# Altium footprint library LukaLIBRARY.PcbLib: 772 footprints (part 15 of 49)
Each footprint in its own frame and in the unit in brackets; x right, y up, seen from the top. Pads: shape width x height; smd on the part's side, far side on the other; paste and mask are expansions set on the pad; w line width, h text height; cw(c..) or ccw(c..) is an arc to the next point about the centre after c.
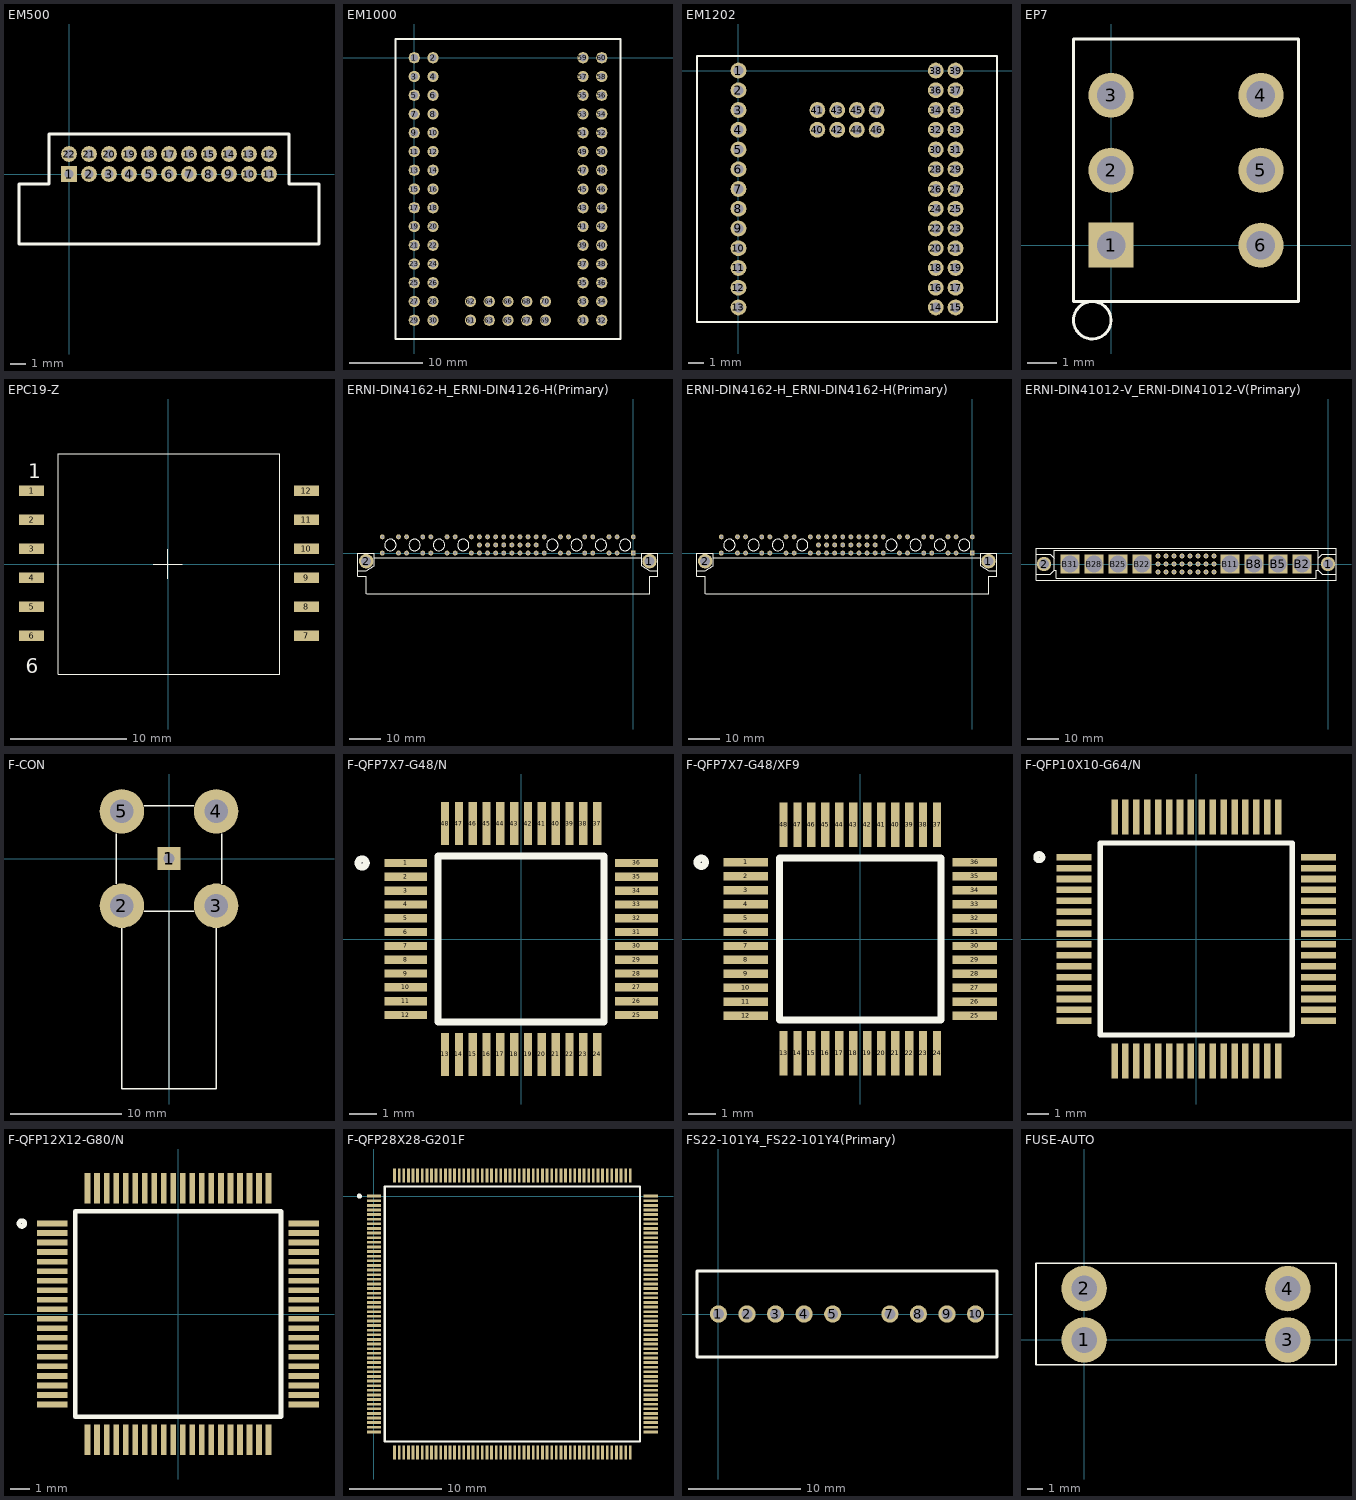
[diagram p14: the footprints below, top view; thin cyan lines are the x and y axes]

## EM500 [mm]
pads (22):
  rect 1x1 hole 0.6 mask-25.4: 1(0,0)
  round 1 hole 0.6 mask-25.4: 2(1.27,0) 3(2.54,0) 4(3.81,0) 5(5.08,0) 6(6.35,0) 7(7.62,0) 8(8.89,0) 9(10.16,0) 10(11.43,0) 11(12.7,0) 12(12.7,1.27) 13(11.43,1.27) 14(10.16,1.27) 15(8.89,1.27) 16(7.62,1.27) 17(6.35,1.27) 18(5.08,1.27) 19(3.81,1.27) 20(2.54,1.27) 21(1.27,1.27) 22(0,1.27)
Top Overlay:
  lines w0.2: -3.175,-4.445 -3.175,-0.635 -1.27,-0.635 -1.27,2.54 13.97,2.54 13.97,-0.635 15.875,-0.635 15.875,-4.445 -3.175,-4.445
Top Solder:
  drawing of 22 lines, arcs and shapes, not listed
Bottom Solder:
  drawing of 22 lines, arcs and shapes, not listed

## EM1000 [mil]
pads (70):
  round 60 hole 38: 1(0,0) 2(100,0) 3(0,-100) 4(100,-100) 5(0,-200) 6(100,-200) 7(0,-300) 8(100,-300) 9(0,-400) 10(100,-400) 11(0,-500) 12(100,-500) 13(0,-600) 14(100,-600) 15(0,-700) 16(100,-700) 17(0,-800) 18(100,-800) 19(0,-900) 20(100,-900) 21(0,-1000) 22(100,-1000) 23(0,-1100) 24(100,-1100) 25(0,-1200) 26(100,-1200) 27(0,-1300) 28(100,-1300) 29(0,-1400) 30(100,-1400) 31(900,-1400) 32(1000,-1400) 33(900,-1300) 34(1000,-1300) 35(900,-1200) 36(1000,-1200) 37(900,-1100) 38(1000,-1100) 39(900,-1000) 40(1000,-1000) 41(900,-900) 42(1000,-900) 43(900,-800) 44(1000,-800) 45(900,-700) 46(1000,-700) 47(900,-600) 48(1000,-600) 49(900,-500) 50(1000,-500) 51(900,-400) 52(1000,-400) 53(900,-300) 54(1000,-300) 55(900,-200) 56(1000,-200) 57(900,-100) 58(1000,-100) 59(900,0) 60(1000,0) 61(300,-1400) 62(300,-1300) 63(400,-1400) 64(400,-1300) 65(500,-1400) 66(500,-1300) 67(600,-1400) 68(600,-1300) 69(700,-1400) 70(700,-1300)
Top Overlay:
  lines w10: -100,-1500 1100,-1500 1100,100 -100,100 -100,-1500

## EM1202 [mil]
pads (47):
  round 40 hole 25: 1(0,0) 2(0,-50) 3(0,-100) 4(0,-150) 5(0,-200) 6(0,-250) 7(0,-300) 8(0,-350) 9(0,-400) 10(0,-450) 11(0,-500) 12(0,-550) 13(0,-600) 14(500,-600) 15(550,-600) 16(500,-550) 17(550,-550) 18(500,-500) 19(550,-500) 20(500,-450) 21(550,-450) 22(500,-400) 23(550,-400) 24(500,-350) 25(550,-350) 26(500,-300) 27(550,-300) 28(500,-250) 29(550,-250) 30(500,-200) 31(550,-200) 32(500,-150) 33(550,-150) 34(500,-100) 35(550,-100) 36(500,-50) 37(550,-50) 38(500,0) 39(550,0) 40(200,-150) 41(200,-100) 42(250,-150) 43(250,-100) 44(300,-150) 45(300,-100) 46(350,-150) 47(350,-100)
Top Overlay:
  lines w5: -105,-637 -105,37 655,37 655,-637 -105,-637

## EP7 [mil]
pads (6):
  rect 60x60 hole 38 mask-1000: 1(0,0)
  round 60 hole 38 mask-1000: 2(0,100) 3(0,200) 4(200,200) 5(200,100)
  round 60 hole 38: 6(200,0)
Top Overlay:
  circle w3.94: c-25,-100 r25
  lines w1: -50,-50 -50,50
  lines w3.94: -50,-75 -50,275 250,275 250,-75 -50,-75
Top Solder:
  region: 200,130.26 192.17,129.23 184.87,126.2 178.6,121.4 173.79,115.13 170.77,107.83 169.74,100 170.77,92.17 173.79,84.87 178.6,78.6 184.87,73.8 192.17,70.77 200,69.74 207.83,70.77 215.13,73.8 221.4,78.6 226.21,84.87 229.23,92.17 230.26,100 229.23,107.83 226.21,115.13 221.4,121.4 215.13,126.2 207.83,129.23
  region: 200,230.26 192.17,229.23 184.87,226.21 178.6,221.4 173.79,215.13 170.77,207.83 169.74,200 170.77,192.17 173.79,184.87 178.6,178.6 184.87,173.79 192.17,170.77 200,169.74 207.83,170.77 215.13,173.79 221.4,178.6 226.21,184.87 229.23,192.17 230.26,200 229.23,207.83 226.21,215.13 221.4,221.4 215.13,226.21 207.83,229.23
  region: 0,130.26 -7.83,129.23 -15.13,126.2 -21.4,121.4 -26.2,115.13 -29.23,107.83 -30.26,100 -29.23,92.17 -26.2,84.87 -21.4,78.6 -15.13,73.8 -7.83,70.77 0,69.74 7.83,70.77 15.13,73.8 21.4,78.6 26.2,84.87 29.23,92.17 30.26,100 29.23,107.83 26.2,115.13 21.4,121.4 15.13,126.2 7.83,129.23
  region: 0,230.26 -7.83,229.23 -15.13,226.21 -21.4,221.4 -26.2,215.13 -29.23,207.83 -30.26,200 -29.23,192.17 -26.2,184.87 -21.4,178.6 -15.13,173.79 -7.83,170.77 0,169.74 7.83,170.77 15.13,173.79 21.4,178.6 26.2,184.87 29.23,192.17 30.26,200 29.23,207.83 26.2,215.13 21.4,221.4 15.13,226.21 7.83,229.23
  region: -30,-30 30,-30 30,30 -30,30
Bottom Solder:
  region: 200,130.26 192.17,129.23 184.87,126.2 178.6,121.4 173.79,115.13 170.77,107.83 169.74,100 170.77,92.17 173.79,84.87 178.6,78.6 184.87,73.8 192.17,70.77 200,69.74 207.83,70.77 215.13,73.8 221.4,78.6 226.21,84.87 229.23,92.17 230.26,100 229.23,107.83 226.21,115.13 221.4,121.4 215.13,126.2 207.83,129.23
  region: 200,230.26 192.17,229.23 184.87,226.21 178.6,221.4 173.79,215.13 170.77,207.83 169.74,200 170.77,192.17 173.79,184.87 178.6,178.6 184.87,173.79 192.17,170.77 200,169.74 207.83,170.77 215.13,173.79 221.4,178.6 226.21,184.87 229.23,192.17 230.26,200 229.23,207.83 226.21,215.13 221.4,221.4 215.13,226.21 207.83,229.23
  region: 0,130.26 -7.83,129.23 -15.13,126.2 -21.4,121.4 -26.2,115.13 -29.23,107.83 -30.26,100 -29.23,92.17 -26.2,84.87 -21.4,78.6 -15.13,73.8 -7.83,70.77 0,69.74 7.83,70.77 15.13,73.8 21.4,78.6 26.2,84.87 29.23,92.17 30.26,100 29.23,107.83 26.2,115.13 21.4,121.4 15.13,126.2 7.83,129.23
  region: 0,230.26 -7.83,229.23 -15.13,226.21 -21.4,221.4 -26.2,215.13 -29.23,207.83 -30.26,200 -29.23,192.17 -26.2,184.87 -21.4,178.6 -15.13,173.79 -7.83,170.77 0,169.74 7.83,170.77 15.13,173.79 21.4,178.6 26.2,184.87 29.23,192.17 30.26,200 29.23,207.83 26.2,215.13 21.4,221.4 15.13,226.21 7.83,229.23
  region: -30,-30 30,-30 30,30 -30,30

## EPC19-Z [mm]
pads (12):
  rect 2.159x0.914 smd mask-25.4: 1(-11.8,6.3) 2(-11.8,3.8) 3(-11.8,1.3) 4(-11.8,-1.2) 5(-11.8,-3.7) 6(-11.8,-6.2) 7(11.9,-6.2) 8(11.9,-3.7) 9(11.9,-1.2) 10(11.9,1.3) 11(11.9,3.8) 12(11.9,6.3)
Top Overlay:
  lines w0.1: -1.32,0 1.21,0 ; -0.05,-1.26 -0.05,0 -0.05,1.27 ; -9.5,-9.5 -9.5,9.5 9.6,9.5 9.6,-9.5 -9.5,-9.5
  text "6" at -12.3,-9.4 h1.25
  text "1" at -12.1,7.4 h1.25
Top Solder:
  region: -10.72,-4.157 -10.72,-3.243 -12.879,-3.243 -12.879,-4.157
  region: -10.72,-6.657 -10.72,-5.743 -12.879,-5.743 -12.879,-6.657
  region: -10.72,3.343 -10.72,4.257 -12.879,4.257 -12.879,3.343
  region: -10.72,0.843 -10.72,1.757 -12.879,1.757 -12.879,0.843
  region: -10.72,-1.657 -10.72,-0.743 -12.879,-0.743 -12.879,-1.657
  region: -10.72,5.843 -10.72,6.757 -12.879,6.757 -12.879,5.843
  region: 12.979,-6.657 12.979,-5.743 10.82,-5.743 10.82,-6.657
  region: 12.979,-4.157 12.979,-3.243 10.82,-3.243 10.82,-4.157
  region: 12.979,-1.657 12.979,-0.743 10.82,-0.743 10.82,-1.657
  region: 12.979,0.843 12.979,1.757 10.82,1.757 10.82,0.843
  region: 12.979,3.343 12.979,4.257 10.82,4.257 10.82,3.343
  region: 12.979,5.843 12.979,6.757 10.82,6.757 10.82,5.843

## ERNI-DIN4162-H_ERNI-DIN4126-H(Primary) [mil]
pads (58):
  round 180 hole 120: 1(200,-100) 2(-3300,-100)
  rect 60x60 hole 38 mask-1000: A1(0,0)
  round 60 hole 38 mask-1000: A3(-200,0) A4(-300,0) A6(-500,0) A7(-600,0) A9(-800,0) A10(-900,0) A12(-1100,0) A13(-1200,0) A14(-1300,0) A15(-1400,0) A16(-1500,0) A17(-1600,0) A18(-1700,0) A19(-1800,0) A20(-1900,0) A21(-2000,0) A23(-2200,0) A24(-2300,0) A26(-2500,0) A27(-2600,0) A29(-2800,0) A30(-2900,0) A32(-3100,0) B13(-1200,100) B14(-1300,100) B15(-1400,100) B16(-1500,100) B17(-1600,100) B18(-1700,100) B19(-1800,100) B20(-1900,100) C1(0,200) C3(-200,200) C4(-300,200) C6(-500,200) C7(-600,200) C9(-800,200) C10(-900,200) C12(-1100,200) C13(-1200,200) C14(-1300,200) C15(-1400,200) C16(-1500,200) C17(-1600,200) C18(-1700,200) C19(-1800,200) C20(-1900,200) C21(-2000,200) C23(-2200,200) C24(-2300,200) C26(-2500,200) C27(-2600,200) C29(-2800,200) C30(-2900,200) C32(-3100,200)
Top Overlay:
  circle w3.94: c-1000,100 r70.71
  circle w3.94: c-700,100 r70.71
  circle w3.94: c-400,100 r70.71
  circle w3.94: c-100,100 r70.71
  circle w3.94: c-3000,100 r70.71
  circle w3.94: c-2700,100 r70.71
  circle w3.94: c-2400,100 r70.71
  circle w3.94: c-2100,100 r70.71
  lines w1: -3400,-220 -3300,-220 -3200,-155 -3200,-55 ; 105,-55 105,-155 205,-220 305,-220
  lines w10: -3300,-500 -3300,-285 -3400,-285 -3400,-5 -3200,-5 -3200,-55 105,-55 105,-5 305,-5 305,-285 205,-285 205,-500 -3295,-500
Top Solder:
  drawing of 56 lines, arcs and shapes, not listed
Bottom Solder:
  drawing of 56 lines, arcs and shapes, not listed

## ERNI-DIN4162-H_ERNI-DIN4162-H(Primary) [mil]
pads (58):
  round 180 hole 120: 1(200,-100) 2(-3300,-100)
  rect 60x60 hole 38 mask-1000: A1(0,0)
  round 60 hole 38 mask-1000: A3(-200,0) A4(-300,0) A6(-500,0) A7(-600,0) A9(-800,0) A10(-900,0) A12(-1100,0) A13(-1200,0) A14(-1300,0) A15(-1400,0) A16(-1500,0) A17(-1600,0) A18(-1700,0) A19(-1800,0) A20(-1900,0) A21(-2000,0) A23(-2200,0) A24(-2300,0) A26(-2500,0) A27(-2600,0) A29(-2800,0) A30(-2900,0) A32(-3100,0) B13(-1200,100) B14(-1300,100) B15(-1400,100) B16(-1500,100) B17(-1600,100) B18(-1700,100) B19(-1800,100) B20(-1900,100) C1(0,200) C3(-200,200) C4(-300,200) C6(-500,200) C7(-600,200) C9(-800,200) C10(-900,200) C12(-1100,200) C13(-1200,200) C14(-1300,200) C15(-1400,200) C16(-1500,200) C17(-1600,200) C18(-1700,200) C19(-1800,200) C20(-1900,200) C21(-2000,200) C23(-2200,200) C24(-2300,200) C26(-2500,200) C27(-2600,200) C29(-2800,200) C30(-2900,200) C32(-3100,200)
Top Overlay:
  circle w3.94: c-1000,100 r70.71
  circle w3.94: c-700,100 r70.71
  circle w3.94: c-400,100 r70.71
  circle w3.94: c-100,100 r70.71
  circle w3.94: c-3000,100 r70.71
  circle w3.94: c-2700,100 r70.71
  circle w3.94: c-2400,100 r70.71
  circle w3.94: c-2100,100 r70.71
  lines w1: -3400,-220 -3300,-220 -3200,-155 -3200,-55 ; 105,-55 105,-155 205,-220 305,-220
  lines w10: -3300,-500 -3300,-285 -3400,-285 -3400,-5 -3200,-5 -3200,-55 105,-55 105,-5 305,-5 305,-285 205,-285 205,-500 -3295,-500
Top Solder:
  drawing of 56 lines, arcs and shapes, not listed
Bottom Solder:
  drawing of 56 lines, arcs and shapes, not listed

## ERNI-DIN41012-V_ERNI-DIN41012-V(Primary) [mil]
pads (34):
  round 180 hole 120: 1(0,0) 2(-3550,0)
  round 60 hole 38 mask-1000: A13(-1425,100) A14(-1525,100) A15(-1625,100) A16(-1725,100) A17(-1825,100) A18(-1925,100) A19(-2025,100) A20(-2125,100) B13(-1425,0) B14(-1525,0) B15(-1625,0) B16(-1725,0) B17(-1825,0) B18(-1925,0) B19(-2025,0) B20(-2125,0) C13(-1425,-100) C14(-1525,-100) C15(-1625,-100) C16(-1725,-100) C17(-1825,-100) C18(-1925,-100) C19(-2025,-100) C20(-2125,-100)
  rect 236.22x236.22 hole 216.54 mask-1000: B2(-325,0) B5(-625,0) B8(-925,0) B11(-1225,0) B22(-2325,0) B25(-2625,0) B28(-2925,0) B31(-3225,0)
Top Overlay:
  lines w1: -3650,-125 -3475,-125 -3425,-75 ; -3650,125 -3475,125 -3425,75 ; 100,-125 -75,-125 -125,-75 ; 100,125 -75,125 -125,75 ; -3425,-75 -3400,-75 -3400,-175 -150,-175 -150,-75 -125,-75 ; -3425,-75 -3425,-25 -3425,75 ; -3425,75 -3425,175 -125,175 -125,75 ; -125,-75 -125,25 -125,75
  lines w10: -3650,-200 100,-200 100,200 -3650,200 -3650,-200
Top Solder:
  drawing of 32 lines, arcs and shapes, not listed
Bottom Solder:
  drawing of 32 lines, arcs and shapes, not listed

## F-CON [mm]
pads (5):
  rect 2.032x2.032 hole 1.016 mask-25.4: 1(0,0)
  round 4 hole 2.1 mask-25.4: 2(-4.25,-4.25) 3(4.25,-4.25) 4(4.25,4.25) 5(-4.25,4.25)
Top Overlay:
  lines w0.025: 0,-20.75 0,-4.75
  lines w0.125: -4.75,-2.25 -4.75,2.25 ; -4.25,-6.25 -4.25,-20.75 4.25,-20.75 4.25,-6.25 ; -2.25,-4.75 2.25,-4.75 ; -2.25,4.75 2.25,4.75 ; 4.75,-2.25 4.75,2.25
Top Solder:
  region: -4.25,6.26 -4.642,6.221 -5.019,6.107 -5.367,5.921 -5.671,5.671 -5.921,5.367 -6.107,5.019 -6.221,4.642 -6.26,4.25 -6.221,3.858 -6.107,3.481 -5.921,3.133 -5.671,2.829 -5.367,2.579 -5.019,2.393 -4.642,2.279 -4.25,2.24 -3.858,2.279 -3.481,2.393 -3.133,2.579 -2.829,2.829 -2.579,3.133 -2.393,3.481 -2.279,3.858 -2.24,4.25 -2.279,4.642 -2.393,5.019 -2.579,5.367 -2.829,5.671 -3.133,5.921 -3.481,6.107 -3.858,6.221
  region: 4.25,6.26 3.858,6.221 3.481,6.107 3.133,5.921 2.829,5.671 2.579,5.367 2.393,5.019 2.279,4.642 2.24,4.25 2.279,3.858 2.393,3.481 2.579,3.133 2.829,2.829 3.133,2.579 3.481,2.393 3.858,2.279 4.25,2.24 4.642,2.279 5.019,2.393 5.367,2.579 5.671,2.829 5.921,3.133 6.107,3.481 6.221,3.858 6.26,4.25 6.221,4.642 6.107,5.019 5.921,5.367 5.671,5.671 5.367,5.921 5.019,6.107 4.642,6.221
  region: -4.25,-2.24 -4.642,-2.279 -5.019,-2.393 -5.367,-2.579 -5.671,-2.829 -5.921,-3.133 -6.107,-3.481 -6.221,-3.858 -6.26,-4.25 -6.221,-4.642 -6.107,-5.019 -5.921,-5.367 -5.671,-5.671 -5.367,-5.921 -5.019,-6.107 -4.642,-6.221 -4.25,-6.26 -3.858,-6.221 -3.481,-6.107 -3.133,-5.921 -2.829,-5.671 -2.579,-5.367 -2.393,-5.019 -2.279,-4.642 -2.24,-4.25 -2.279,-3.858 -2.393,-3.481 -2.579,-3.133 -2.829,-2.829 -3.133,-2.579 -3.481,-2.393 -3.858,-2.279
  region: 4.25,-2.24 3.858,-2.279 3.481,-2.393 3.133,-2.579 2.829,-2.829 2.579,-3.133 2.393,-3.481 2.279,-3.858 2.24,-4.25 2.279,-4.642 2.393,-5.019 2.579,-5.367 2.829,-5.671 3.133,-5.921 3.481,-6.107 3.858,-6.221 4.25,-6.26 4.642,-6.221 5.019,-6.107 5.367,-5.921 5.671,-5.671 5.921,-5.367 6.107,-5.019 6.221,-4.642 6.26,-4.25 6.221,-3.858 6.107,-3.481 5.921,-3.133 5.671,-2.829 5.367,-2.579 5.019,-2.393 4.642,-2.279
  region: -1.016,-1.016 1.016,-1.016 1.016,1.016 -1.016,1.016
Bottom Solder:
  region: -4.25,6.26 -4.642,6.221 -5.019,6.107 -5.367,5.921 -5.671,5.671 -5.921,5.367 -6.107,5.019 -6.221,4.642 -6.26,4.25 -6.221,3.858 -6.107,3.481 -5.921,3.133 -5.671,2.829 -5.367,2.579 -5.019,2.393 -4.642,2.279 -4.25,2.24 -3.858,2.279 -3.481,2.393 -3.133,2.579 -2.829,2.829 -2.579,3.133 -2.393,3.481 -2.279,3.858 -2.24,4.25 -2.279,4.642 -2.393,5.019 -2.579,5.367 -2.829,5.671 -3.133,5.921 -3.481,6.107 -3.858,6.221
  region: 4.25,6.26 3.858,6.221 3.481,6.107 3.133,5.921 2.829,5.671 2.579,5.367 2.393,5.019 2.279,4.642 2.24,4.25 2.279,3.858 2.393,3.481 2.579,3.133 2.829,2.829 3.133,2.579 3.481,2.393 3.858,2.279 4.25,2.24 4.642,2.279 5.019,2.393 5.367,2.579 5.671,2.829 5.921,3.133 6.107,3.481 6.221,3.858 6.26,4.25 6.221,4.642 6.107,5.019 5.921,5.367 5.671,5.671 5.367,5.921 5.019,6.107 4.642,6.221
  region: -4.25,-2.24 -4.642,-2.279 -5.019,-2.393 -5.367,-2.579 -5.671,-2.829 -5.921,-3.133 -6.107,-3.481 -6.221,-3.858 -6.26,-4.25 -6.221,-4.642 -6.107,-5.019 -5.921,-5.367 -5.671,-5.671 -5.367,-5.921 -5.019,-6.107 -4.642,-6.221 -4.25,-6.26 -3.858,-6.221 -3.481,-6.107 -3.133,-5.921 -2.829,-5.671 -2.579,-5.367 -2.393,-5.019 -2.279,-4.642 -2.24,-4.25 -2.279,-3.858 -2.393,-3.481 -2.579,-3.133 -2.829,-2.829 -3.133,-2.579 -3.481,-2.393 -3.858,-2.279
  region: 4.25,-2.24 3.858,-2.279 3.481,-2.393 3.133,-2.579 2.829,-2.829 2.579,-3.133 2.393,-3.481 2.279,-3.858 2.24,-4.25 2.279,-4.642 2.393,-5.019 2.579,-5.367 2.829,-5.671 3.133,-5.921 3.481,-6.107 3.858,-6.221 4.25,-6.26 4.642,-6.221 5.019,-6.107 5.367,-5.921 5.671,-5.671 5.921,-5.367 6.107,-5.019 6.221,-4.642 6.26,-4.25 6.221,-3.858 6.107,-3.481 5.921,-3.133 5.671,-2.829 5.367,-2.579 5.019,-2.393 4.642,-2.279
  region: -1.016,-1.016 1.016,-1.016 1.016,1.016 -1.016,1.016

## F-QFP7X7-G48/N [mm]
pads (48):
  rect 1.55x0.3 smd: 1(-4.175,2.75) 2(-4.175,2.25) 3(-4.175,1.75) 4(-4.175,1.25) 5(-4.175,0.75) 6(-4.175,0.25) 7(-4.175,-0.25) 8(-4.175,-0.75) 9(-4.175,-1.25) 10(-4.175,-1.75) 11(-4.175,-2.25) 12(-4.175,-2.75) 25(4.175,-2.75) 26(4.175,-2.25) 27(4.175,-1.75) 28(4.175,-1.25) 29(4.175,-0.75) 30(4.175,-0.25) 31(4.175,0.25) 32(4.175,0.75) 33(4.175,1.25) 34(4.175,1.75) 35(4.175,2.25) 36(4.175,2.75)
  rect 0.3x1.55 smd: 13(-2.75,-4.175) 14(-2.25,-4.175) 15(-1.75,-4.175) 16(-1.25,-4.175) 17(-0.75,-4.175) 18(-0.25,-4.175) 19(0.25,-4.175) 20(0.75,-4.175) 21(1.25,-4.175) 22(1.75,-4.175) 23(2.25,-4.175) 24(2.75,-4.175) 37(2.75,4.175) 38(2.25,4.175) 39(1.75,4.175) 40(1.25,4.175) 41(0.75,4.175) 42(0.25,4.175) 43(-0.25,4.175) 44(-0.75,4.175) 45(-1.25,4.175) 46(-1.75,4.175) 47(-2.25,4.175) 48(-2.75,4.175)
Top Overlay:
  circle w0.25: c-5.75,2.75 r0.15
  lines w0.25: -3,-3 -3,3 3,3 3,-3 -3,-3

## F-QFP7X7-G48/XF9 [mm]
pads (48):
  rect 1.6x0.3 smd: 1(-4.1,2.75) 2(-4.1,2.25) 3(-4.1,1.75) 4(-4.1,1.25) 5(-4.1,0.75) 6(-4.1,0.25) 7(-4.1,-0.25) 8(-4.1,-0.75) 9(-4.1,-1.25) 10(-4.1,-1.75) 11(-4.1,-2.25) 12(-4.1,-2.75) 25(4.1,-2.75) 26(4.1,-2.25) 27(4.1,-1.75) 28(4.1,-1.25) 29(4.1,-0.75) 30(4.1,-0.25) 31(4.1,0.25) 32(4.1,0.75) 33(4.1,1.25) 34(4.1,1.75) 35(4.1,2.25) 36(4.1,2.75)
  rect 0.3x1.6 smd: 13(-2.75,-4.1) 14(-2.25,-4.1) 15(-1.75,-4.1) 16(-1.25,-4.1) 17(-0.75,-4.1) 18(-0.25,-4.1) 19(0.25,-4.1) 20(0.75,-4.1) 21(1.25,-4.1) 22(1.75,-4.1) 23(2.25,-4.1) 24(2.75,-4.1) 37(2.75,4.1) 38(2.25,4.1) 39(1.75,4.1) 40(1.25,4.1) 41(0.75,4.1) 42(0.25,4.1) 43(-0.25,4.1) 44(-0.75,4.1) 45(-1.25,4.1) 46(-1.75,4.1) 47(-2.25,4.1) 48(-2.75,4.1)
Top Overlay:
  circle w0.25: c-5.7,2.75 r0.15
  lines w0.25: -2.9,-2.9 -2.9,2.9 2.9,2.9 2.9,-2.9 -2.9,-2.9

## F-QFP10X10-G64/N [mm]
pads (64):
  rect 1.6x0.3 smd: 1(-5.6,3.75) 2(-5.6,3.25) 3(-5.6,2.75) 4(-5.6,2.25) 5(-5.6,1.75) 6(-5.6,1.25) 7(-5.6,0.75) 8(-5.6,0.25) 9(-5.6,-0.25) 10(-5.6,-0.75) 11(-5.6,-1.25) 12(-5.6,-1.75) 13(-5.6,-2.25) 14(-5.6,-2.75) 15(-5.6,-3.25) 16(-5.6,-3.75) 33(5.6,-3.75) 34(5.6,-3.25) 35(5.6,-2.75) 36(5.6,-2.25) 37(5.6,-1.75) 38(5.6,-1.25) 39(5.6,-0.75) 40(5.6,-0.25) 41(5.6,0.25) 42(5.6,0.75) 43(5.6,1.25) 44(5.6,1.75) 45(5.6,2.25) 46(5.6,2.75) 47(5.6,3.25) 48(5.6,3.75)
  rect 0.3x1.6 smd: 17(-3.75,-5.6) 18(-3.25,-5.6) 19(-2.75,-5.6) 20(-2.25,-5.6) 21(-1.75,-5.6) 22(-1.25,-5.6) 23(-0.75,-5.6) 24(-0.25,-5.6) 25(0.25,-5.6) 26(0.75,-5.6) 27(1.25,-5.6) 28(1.75,-5.6) 29(2.25,-5.6) 30(2.75,-5.6) 31(3.25,-5.6) 32(3.75,-5.6) 49(3.75,5.6) 50(3.25,5.6) 51(2.75,5.6) 52(2.25,5.6) 53(1.75,5.6) 54(1.25,5.6) 55(0.75,5.6) 56(0.25,5.6) 57(-0.25,5.6) 58(-0.75,5.6) 59(-1.25,5.6) 60(-1.75,5.6) 61(-2.25,5.6) 62(-2.75,5.6) 63(-3.25,5.6) 64(-3.75,5.6)
Top Overlay:
  circle w0.25: c-7.2,3.75 r0.15
  lines w0.25: -4.4,-4.4 4.4,-4.4 4.4,4.4 -4.4,4.4 -4.4,-4.4

## F-QFP12X12-G80/N [mm]
pads (80):
  rect 1.6x0.3 smd: 1(-6.6,4.75) 2(-6.6,4.25) 3(-6.6,3.75) 4(-6.6,3.25) 5(-6.6,2.75) 6(-6.6,2.25) 7(-6.6,1.75) 8(-6.6,1.25) 9(-6.6,0.75) 10(-6.6,0.25) 11(-6.6,-0.25) 12(-6.6,-0.75) 13(-6.6,-1.25) 14(-6.6,-1.75) 15(-6.6,-2.25) 16(-6.6,-2.75) 17(-6.6,-3.25) 18(-6.6,-3.75) 19(-6.6,-4.25) 20(-6.6,-4.75) 41(6.6,-4.75) 42(6.6,-4.25) 43(6.6,-3.75) 44(6.6,-3.25) 45(6.6,-2.75) 46(6.6,-2.25) 47(6.6,-1.75) 48(6.6,-1.25) 49(6.6,-0.75) 50(6.6,-0.25) 51(6.6,0.25) 52(6.6,0.75) 53(6.6,1.25) 54(6.6,1.75) 55(6.6,2.25) 56(6.6,2.75) 57(6.6,3.25) 58(6.6,3.75) 59(6.6,4.25) 60(6.6,4.75)
  rect 0.3x1.6 smd: 21(-4.75,-6.6) 22(-4.25,-6.6) 23(-3.75,-6.6) 24(-3.25,-6.6) 25(-2.75,-6.6) 26(-2.25,-6.6) 27(-1.75,-6.6) 28(-1.25,-6.6) 29(-0.75,-6.6) 30(-0.25,-6.6) 31(0.25,-6.6) 32(0.75,-6.6) 33(1.25,-6.6) 34(1.75,-6.6) 35(2.25,-6.6) 36(2.75,-6.6) 37(3.25,-6.6) 38(3.75,-6.6) 39(4.25,-6.6) 40(4.75,-6.6) 61(4.75,6.6) 62(4.25,6.6) 63(3.75,6.6) 64(3.25,6.6) 65(2.75,6.6) 66(2.25,6.6) 67(1.75,6.6) 68(1.25,6.6) 69(0.75,6.6) 70(0.25,6.6) 71(-0.25,6.6) 72(-0.75,6.6) 73(-1.25,6.6) 74(-1.75,6.6) 75(-2.25,6.6) 76(-2.75,6.6) 77(-3.25,6.6) 78(-3.75,6.6) 79(-4.25,6.6) 80(-4.75,6.6)
Top Overlay:
  circle w0.25: c-8.2,4.75 r0.15
  lines w0.25: -5.4,-5.4 -5.4,5.4 5.4,5.4 5.4,-5.4 -5.4,-5.4

## F-QFP28X28-G201F [mm]
pads (208):
  rect 1.55x0.3 smd: 1(0,0) 2(0,-0.5) 3(0,-1) 4(0,-1.5) 5(0,-2) 6(0,-2.5) 7(0,-3) 8(0,-3.5) 9(0,-4) 10(0,-4.5) 11(0,-5) 12(0,-5.5) 13(0,-6) 14(0,-6.5) 15(0,-7) 16(0,-7.5) 17(0,-8) 18(0,-8.5) 19(0,-9) 20(0,-9.5) 21(0,-10) 22(0,-10.5) 23(0,-11) 24(0,-11.5) 25(0,-12) 26(0,-12.5) 27(0,-13) 28(0,-13.5) 29(0,-14) 30(0,-14.5) 31(0,-15) 32(0,-15.5) 33(0,-16) 34(0,-16.5) 35(0,-17) 36(0,-17.5) 37(0,-18) 38(0,-18.5) 39(0,-19) 40(0,-19.5) 41(0,-20) 42(0,-20.5) 43(0,-21) 44(0,-21.5) 45(0,-22) 46(0,-22.5) 47(0,-23) 48(0,-23.5) 49(0,-24) 50(0,-24.5) 51(0,-25) 52(0,-25.5) 105(29.95,-25.5) 106(29.95,-25) 107(29.95,-24.5) 108(29.95,-24) 109(29.95,-23.5) 110(29.95,-23) 111(29.95,-22.5) 112(29.95,-22) 113(29.95,-21.5) 114(29.95,-21) 115(29.95,-20.5) 116(29.95,-20) 117(29.95,-19.5) 118(29.95,-19) 119(29.95,-18.5) 120(29.95,-18) 121(29.95,-17.5) 122(29.95,-17) 123(29.95,-16.5) 124(29.95,-16) 125(29.95,-15.5) 126(29.95,-15) 127(29.95,-14.5) 128(29.95,-14) 129(29.95,-13.5) 130(29.95,-13) 131(29.95,-12.5) 132(29.95,-12) 133(29.95,-11.5) 134(29.95,-11) 135(29.95,-10.5) 136(29.95,-10) 137(29.95,-9.5) 138(29.95,-9) 139(29.95,-8.5) 140(29.95,-8) 141(29.95,-7.5) 142(29.95,-7) 143(29.95,-6.5) 144(29.95,-6) 145(29.95,-5.5) 146(29.95,-5) 147(29.95,-4.5) 148(29.95,-4) 149(29.95,-3.5) 150(29.95,-3) 151(29.95,-2.5) 152(29.95,-2) 153(29.95,-1.5) 154(29.95,-1) 155(29.95,-0.5) 156(29.95,0)
  rect 0.3x1.55 smd: 53(2.225,-27.725) 54(2.725,-27.725) 55(3.225,-27.725) 56(3.725,-27.725) 57(4.225,-27.725) 58(4.725,-27.725) 59(5.225,-27.725) 60(5.725,-27.725) 61(6.225,-27.725) 62(6.725,-27.725) 63(7.225,-27.725) 64(7.725,-27.725) 65(8.225,-27.725) 66(8.725,-27.725) 67(9.225,-27.725) 68(9.725,-27.725) 69(10.225,-27.725) 70(10.725,-27.725) 71(11.225,-27.725) 72(11.725,-27.725) 73(12.225,-27.725) 74(12.725,-27.725) 75(13.225,-27.725) 76(13.725,-27.725) 77(14.225,-27.725) 78(14.725,-27.725) 79(15.225,-27.725) 80(15.725,-27.725) 81(16.225,-27.725) 82(16.725,-27.725) 83(17.225,-27.725) 84(17.725,-27.725) 85(18.225,-27.725) 86(18.725,-27.725) 87(19.225,-27.725) 88(19.725,-27.725) 89(20.225,-27.725) 90(20.725,-27.725) 91(21.225,-27.725) 92(21.725,-27.725) 93(22.225,-27.725) 94(22.725,-27.725) 95(23.225,-27.725) 96(23.725,-27.725) 97(24.225,-27.725) 98(24.725,-27.725) 99(25.225,-27.725) 100(25.725,-27.725) 101(26.225,-27.725) 102(26.725,-27.725) 103(27.225,-27.725) 104(27.725,-27.725) 157(27.725,2.225) 158(27.225,2.225) 159(26.725,2.225) 160(26.225,2.225) 161(25.725,2.225) 162(25.225,2.225) 163(24.725,2.225) 164(24.225,2.225) 165(23.725,2.225) 166(23.225,2.225) 167(22.725,2.225) 168(22.225,2.225) 169(21.725,2.225) 170(21.225,2.225) 171(20.725,2.225) 172(20.225,2.225) 173(19.725,2.225) 174(19.225,2.225) 175(18.725,2.225) 176(18.225,2.225) 177(17.725,2.225) 178(17.225,2.225) 179(16.725,2.225) 180(16.225,2.225) 181(15.725,2.225) 182(15.225,2.225) 183(14.725,2.225) 184(14.225,2.225) 185(13.725,2.225) 186(13.225,2.225) 187(12.725,2.225) 188(12.225,2.225) 189(11.725,2.225) 190(11.225,2.225) 191(10.725,2.225) 192(10.225,2.225) 193(9.725,2.225) 194(9.225,2.225) 195(8.725,2.225) 196(8.225,2.225) 197(7.725,2.225) 198(7.225,2.225) 199(6.725,2.225) 200(6.225,2.225) 201(5.725,2.225) 202(5.225,2.225) 203(4.725,2.225) 204(4.225,2.225) 205(3.725,2.225) 206(3.225,2.225) 207(2.725,2.225) 208(2.225,2.225)
Top Overlay:
  circle w0.25: c-1.575,0 r0.15
  lines w0.25: 1.175,-26.55 1.175,1.05 28.775,1.05 28.775,-26.55 1.175,-26.55

## FS22-101Y4_FS22-101Y4(Primary) [mil]
pads (9):
  round 60 hole 38: 1(0,0) 2(100,0) 3(200,0) 4(300,0) 5(400,0) 7(600,0) 8(700,0) 9(800,0) 10(900,0)
Top Overlay:
  lines w10: -75,-150 975,-150 975,150 -75,150 -75,-150

## FUSE-AUTO [mm]
pads (4):
  round 3 hole 1.7 mask-25.4: 1(0,-0.01) 2(0,3.4) 3(13.47,-0.01) 4(13.47,3.39)
Top Overlay:
  lines w0.1: -3.19,-1.65 16.66,-1.65 ; -3.19,-1.64 -3.19,5.07 ; -3.18,5.07 16.66,5.07 ; 16.66,-1.64 16.66,5.06
Top Solder:
  region: 0,1.497 -0.294,1.468 -0.577,1.383 -0.837,1.243 -1.066,1.056 -1.253,0.827 -1.393,0.567 -1.478,0.284 -1.507,-0.01 -1.478,-0.304 -1.393,-0.587 -1.253,-0.847 -1.066,-1.076 -0.837,-1.263 -0.577,-1.403 -0.294,-1.488 0,-1.517 0.294,-1.488 0.577,-1.403 0.837,-1.263 1.066,-1.076 1.253,-0.847 1.393,-0.587 1.478,-0.304 1.507,-0.01 1.478,0.284 1.393,0.567 1.253,0.827 1.066,1.056 0.837,1.243 0.577,1.383 0.294,1.468
  region: 13.47,1.497 13.176,1.468 12.893,1.383 12.633,1.243 12.404,1.056 12.217,0.827 12.077,0.567 11.992,0.284 11.963,-0.01 11.992,-0.304 12.077,-0.587 12.217,-0.847 12.404,-1.076 12.633,-1.263 12.893,-1.403 13.176,-1.488 13.47,-1.517 13.764,-1.488 14.047,-1.403 14.307,-1.263 14.536,-1.076 14.723,-0.847 14.863,-0.587 14.948,-0.304 14.977,-0.01 14.948,0.284 14.863,0.567 14.723,0.827 14.536,1.056 14.307,1.243 14.047,1.383 13.764,1.468
  region: 0,4.907 -0.294,4.878 -0.577,4.793 -0.837,4.653 -1.066,4.466 -1.253,4.237 -1.393,3.977 -1.478,3.694 -1.507,3.4 -1.478,3.106 -1.393,2.823 -1.253,2.563 -1.066,2.334 -0.837,2.147 -0.577,2.007 -0.294,1.922 0,1.893 0.294,1.922 0.577,2.007 0.837,2.147 1.066,2.334 1.253,2.563 1.393,2.823 1.478,3.106 1.507,3.4 1.478,3.694 1.393,3.977 1.253,4.237 1.066,4.466 0.837,4.653 0.577,4.793 0.294,4.878
  region: 13.47,4.897 13.176,4.868 12.893,4.783 12.633,4.643 12.404,4.456 12.217,4.227 12.077,3.967 11.992,3.684 11.963,3.39 11.992,3.096 12.077,2.813 12.217,2.553 12.404,2.324 12.633,2.137 12.893,1.997 13.176,1.912 13.47,1.883 13.764,1.912 14.047,1.997 14.307,2.137 14.536,2.324 14.723,2.553 14.863,2.813 14.948,3.096 14.977,3.39 14.948,3.684 14.863,3.967 14.723,4.227 14.536,4.456 14.307,4.643 14.047,4.783 13.764,4.868
Bottom Solder:
  region: 0,1.497 -0.294,1.468 -0.577,1.383 -0.837,1.243 -1.066,1.056 -1.253,0.827 -1.393,0.567 -1.478,0.284 -1.507,-0.01 -1.478,-0.304 -1.393,-0.587 -1.253,-0.847 -1.066,-1.076 -0.837,-1.263 -0.577,-1.403 -0.294,-1.488 0,-1.517 0.294,-1.488 0.577,-1.403 0.837,-1.263 1.066,-1.076 1.253,-0.847 1.393,-0.587 1.478,-0.304 1.507,-0.01 1.478,0.284 1.393,0.567 1.253,0.827 1.066,1.056 0.837,1.243 0.577,1.383 0.294,1.468
  region: 13.47,1.497 13.176,1.468 12.893,1.383 12.633,1.243 12.404,1.056 12.217,0.827 12.077,0.567 11.992,0.284 11.963,-0.01 11.992,-0.304 12.077,-0.587 12.217,-0.847 12.404,-1.076 12.633,-1.263 12.893,-1.403 13.176,-1.488 13.47,-1.517 13.764,-1.488 14.047,-1.403 14.307,-1.263 14.536,-1.076 14.723,-0.847 14.863,-0.587 14.948,-0.304 14.977,-0.01 14.948,0.284 14.863,0.567 14.723,0.827 14.536,1.056 14.307,1.243 14.047,1.383 13.764,1.468
  region: 0,4.907 -0.294,4.878 -0.577,4.793 -0.837,4.653 -1.066,4.466 -1.253,4.237 -1.393,3.977 -1.478,3.694 -1.507,3.4 -1.478,3.106 -1.393,2.823 -1.253,2.563 -1.066,2.334 -0.837,2.147 -0.577,2.007 -0.294,1.922 0,1.893 0.294,1.922 0.577,2.007 0.837,2.147 1.066,2.334 1.253,2.563 1.393,2.823 1.478,3.106 1.507,3.4 1.478,3.694 1.393,3.977 1.253,4.237 1.066,4.466 0.837,4.653 0.577,4.793 0.294,4.878
  region: 13.47,4.897 13.176,4.868 12.893,4.783 12.633,4.643 12.404,4.456 12.217,4.227 12.077,3.967 11.992,3.684 11.963,3.39 11.992,3.096 12.077,2.813 12.217,2.553 12.404,2.324 12.633,2.137 12.893,1.997 13.176,1.912 13.47,1.883 13.764,1.912 14.047,1.997 14.307,2.137 14.536,2.324 14.723,2.553 14.863,2.813 14.948,3.096 14.977,3.39 14.948,3.684 14.863,3.967 14.723,4.227 14.536,4.456 14.307,4.643 14.047,4.783 13.764,4.868